# Altium footprint library Design III PCB Library.PcbLib: 98 footprints (part 7 of 7)
Each footprint in its own frame and in the unit in brackets; x right, y up, seen from the top. Pads: shape width x height; smd on the part's side, far side on the other; paste and mask are expansions set on the pad; w line width, h text height; cw(c..) or ccw(c..) is an arc to the next point about the centre after c.
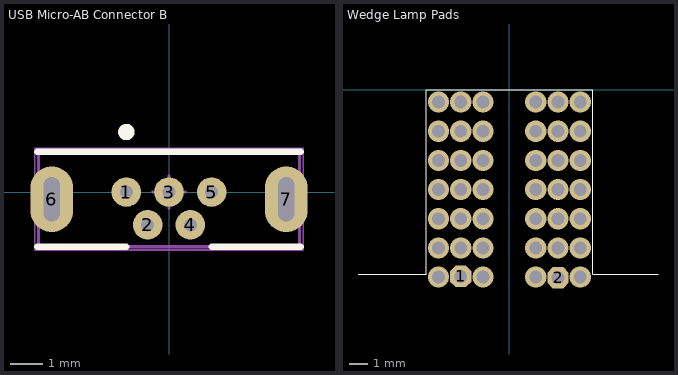
[diagram p6: the footprints below, top view; thin cyan lines are the x and y axes]

## USB Micro-AB Connector B [mm] "USB - Micro AB 2.0 Receptacle Connector 5 Position, Vertical, Through Hole with 2.30 mm (Standard) Shell Stakes, 5-Pin THD, RoHS, Tape and Reel"
pads (7):
  round 0.9 hole 0.4: 1(-1.3,0) 2(-0.65,-1) 3(0,0) 4(0.65,-1) 5(1.3,0)
  oval 1.3x2 hole 0.5 slot 1.35 at 90 deg: 6(-3.575,-0.22) 7(3.575,-0.22)
Top Overlay:
  circle w0.25: c-1.3,1.83 r0.125
  lines w0.2: -4.025,-1.675 -1.3,-1.675 ; -4.025,1.225 4.025,1.225 ; 1.3,-1.675 4.025,-1.675
Mechanical 13:
  lines w0.1: -3.98,-1.67 -3.98,1.23 3.98,1.23 3.98,-1.67 -3.98,-1.67
Mechanical 15:
  lines w0.05: -4.1,-1.77 -4.1,1.33 4.1,1.33 4.1,-1.77 -4.1,-1.77
  lines w0.1: -0.5,0 0.5,0 ; 0,-0.5 0,0.5
3D body "USB3106-30-0230-A_revB.step": height 5.61, standoff -2.3, extent -3.98,-1.684 3.98,1.251

## Wedge Lamp Pads [mil] "Wedge Lamp Socket"
pads (2):
  oct 46x46 hole 27.6: 1(-104.85,-403.18) 2(105.15,-406.18)
via 153.15,-404.68 diameter 46 hole 27.6
via 57.15,-404.68 diameter 46 hole 27.6
via -152.85,-404.68 diameter 46 hole 27.6
via -56.85,-404.68 diameter 46 hole 27.6
via 153.15,-341.68 diameter 46 hole 27.6
via 105.15,-341.68 diameter 46 hole 27.6
via 57.15,-341.68 diameter 46 hole 27.6
via -152.85,-341.68 diameter 46 hole 27.6
via -104.85,-341.68 diameter 46 hole 27.6
via -56.85,-341.68 diameter 46 hole 27.6
via 153.15,-278.68 diameter 46 hole 27.6
via 105.15,-278.68 diameter 46 hole 27.6
via 57.15,-278.68 diameter 46 hole 27.6
via -152.85,-278.68 diameter 46 hole 27.6
via -104.85,-278.68 diameter 46 hole 27.6
via -56.85,-278.68 diameter 46 hole 27.6
via 153.15,-215.68 diameter 46 hole 27.6
via 105.15,-215.68 diameter 46 hole 27.6
via 57.15,-215.68 diameter 46 hole 27.6
via -152.85,-215.68 diameter 46 hole 27.6
via -104.85,-215.68 diameter 46 hole 27.6
via -56.85,-215.68 diameter 46 hole 27.6
via 153.15,-152.68 diameter 46 hole 27.6
via 105.15,-152.68 diameter 46 hole 27.6
via 57.15,-152.68 diameter 46 hole 27.6
via -152.85,-152.68 diameter 46 hole 27.6
via -104.85,-152.68 diameter 46 hole 27.6
via -56.85,-152.68 diameter 46 hole 27.6
via 153.15,-89.68 diameter 46 hole 27.6
via 105.15,-89.68 diameter 46 hole 27.6
via 57.15,-89.68 diameter 46 hole 27.6
via -152.85,-89.68 diameter 46 hole 27.6
via -104.85,-89.68 diameter 46 hole 27.6
via -56.85,-89.68 diameter 46 hole 27.6
via -56.85,-26.68 diameter 46 hole 27.6
via -104.85,-26.68 diameter 46 hole 27.6
via -152.85,-26.68 diameter 46 hole 27.6
via 57.15,-26.68 diameter 46 hole 27.6
via 105.15,-26.68 diameter 46 hole 27.6
via 153.15,-26.68 diameter 46 hole 27.6
Top Overlay:
  lines w1: -326.85,-398.68 -179.85,-398.68 -179.85,0.32 180.15,0.32 180.15,-398.68 321.15,-398.68
Multi-Layer:
  region: 180.15,-398.18 180.15,-0.18 30.15,-0.18 30.15,-398.18
  region: -29.85,-398.18 -29.85,-0.18 -179.85,-0.18 -179.85,-398.18